# Altium footprint library RPSLib_Connectors.PcbLib: 85 footprints (part 2 of 6)
Each footprint in its own frame and in the unit in brackets; x right, y up, seen from the top. Pads: shape width x height; smd on the part's side, far side on the other; paste and mask are expansions set on the pad; w line width, h text height; cw(c..) or ccw(c..) is an arc to the next point about the centre after c.
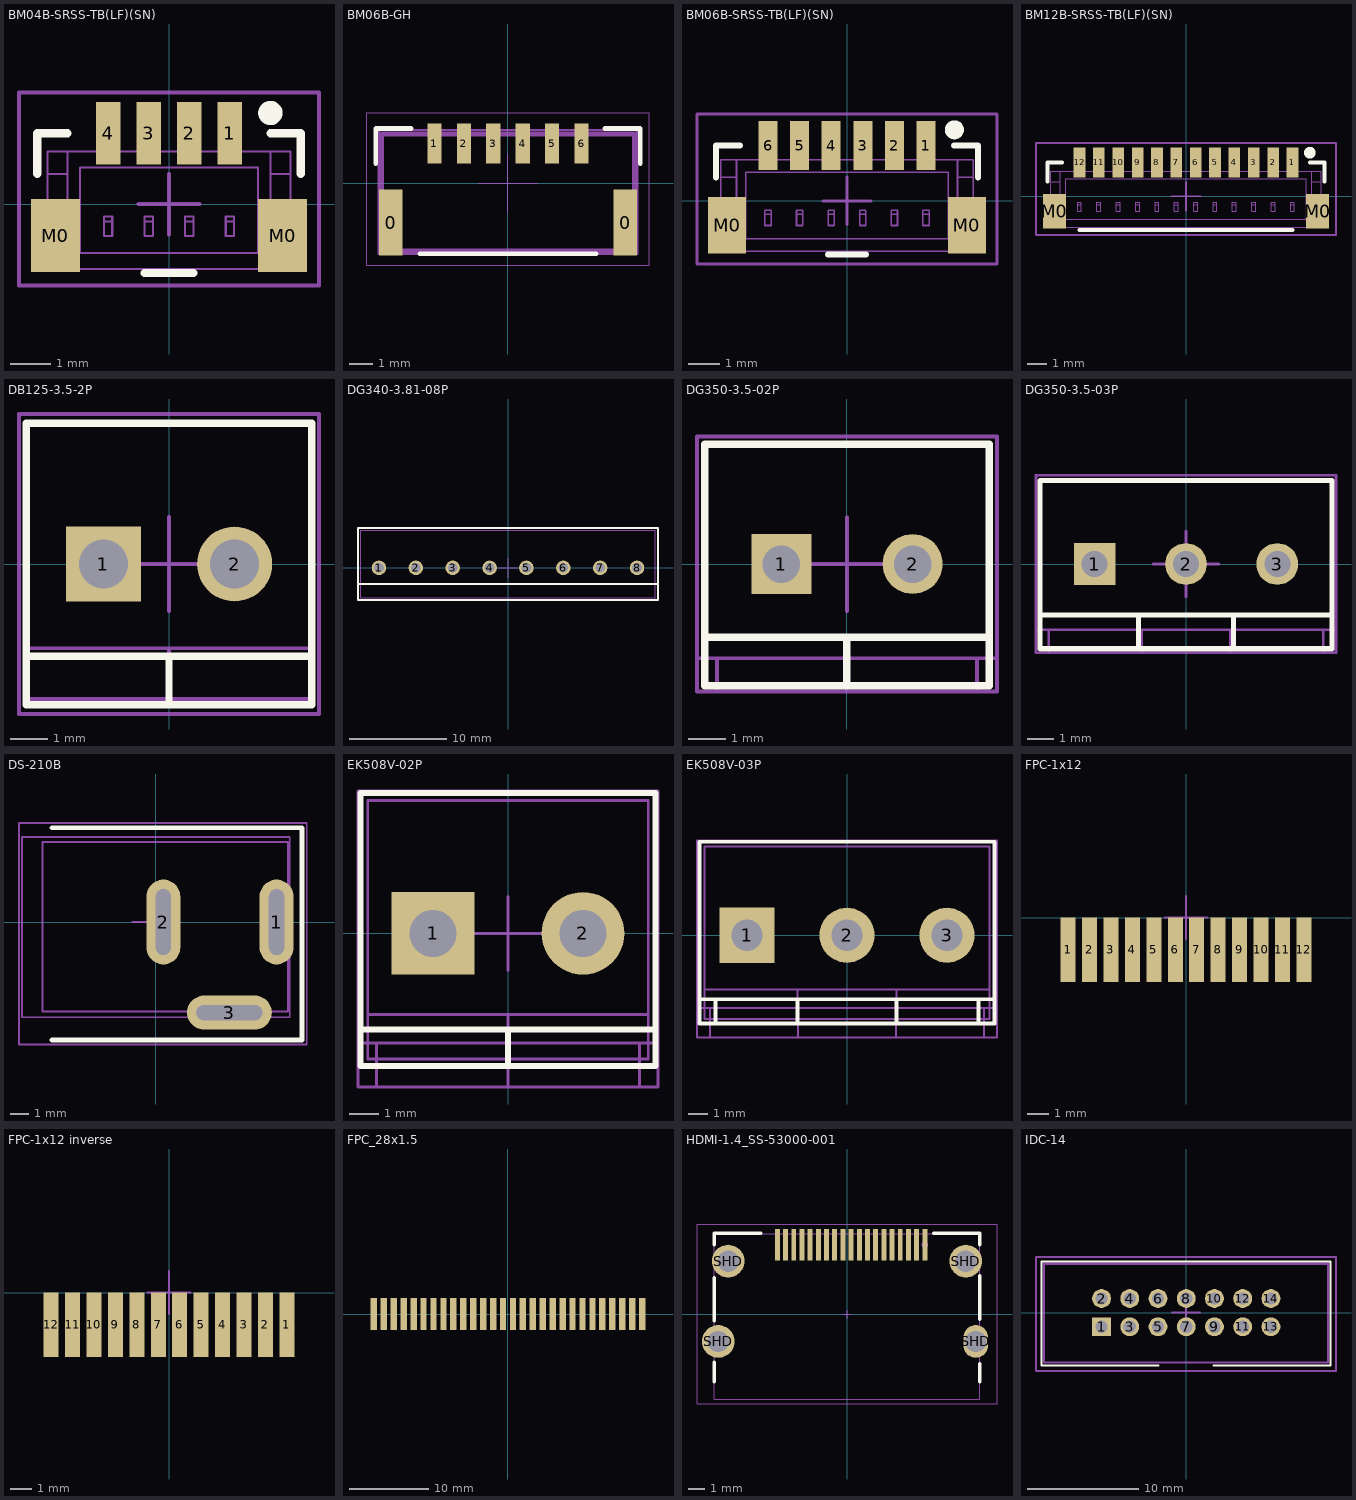
[diagram p1: the footprints below, top view; thin cyan lines are the x and y axes]

## BM04B-SRSS-TB(LF)(SN) [mm] "JST 1.0 mm pitch connector"
height 5
pads (6):
  rect 0.6x1.55 smd mask+0.07: 1(1.5,1.75) 2(0.5,1.75) 3(-0.5,1.75) 4(-1.5,1.75)
  rect 1.2x1.8 smd mask+0.07: M0(-2.8,-0.775) M0(2.8,-0.775)
Top Overlay:
  circle w0.4: c2.5,2.25 r0.1
  lines w0.2: -3.25,0.75 -3.25,1.75 -2.5,1.75 ; -0.6,-1.7 0.6,-1.7 ; 2.5,1.75 3.25,1.75 3.25,0.75
Top Designator:
  text ".Designator" at -2.868,-0.271 h1.2
Top Courtyard:
  lines w0.1: -0.75,0 0.75,0 ; 0,-0.75 0,0.75 ; -3.7,-2 3.7,-2 3.7,2.75 -3.7,2.75 -3.7,-2
Top 3D Body:
  lines w0.05: -2.5,0.75 -3,0.75 ; -1.6,1.3 -1.6,2 -1.4,2 -1.4,1.3 ; -0.6,1.3 -0.6,2 -0.4,2 -0.4,1.3 ; 0.4,1.3 0.4,2 0.6,2 0.6,1.3 ; 1.4,1.3 1.4,2 1.6,2 1.6,1.3 ; 2.5,0.75 3,0.75 ; -3,0.1 -3,-1.6 3,-1.6 3,0.1 ; -3,0.1 -3,0.75 ; -3,0.1 -2.5,0.1 -2.5,1.3 ; -3,0.75 -3,1.3 -2.5,1.3 ; -2.5,1.3 2.5,1.3 ; -2.2,-0.7 -2.2,-1.2 2.2,-1.2 2.2,-0.7 ; -2.2,-0.7 -2.2,-0.1 ; -2.2,-0.7 -2.55,-0.7 -2.55,-0.1 -2.2,-0.1 ; -2.2,-0.1 -2.2,0.9 2.2,0.9 2.2,-0.1 ; -1.6,-0.43 -1.6,-0.78 -1.4,-0.78 -1.4,-0.43 ; -1.6,-0.43 -1.4,-0.43 ; -1.6,-0.43 -1.6,-0.3 -1.4,-0.3 -1.4,-0.43 ; -0.6,-0.43 -0.4,-0.43 ; -0.6,-0.43 -0.6,-0.78 -0.4,-0.78 -0.4,-0.43 ; -0.6,-0.43 -0.6,-0.3 -0.4,-0.3 -0.4,-0.43 ; 0.4,-0.43 0.6,-0.43 ; 0.4,-0.43 0.4,-0.78 0.6,-0.78 0.6,-0.43 ; 0.4,-0.43 0.4,-0.3 0.6,-0.3 0.6,-0.43 ; 1.4,-0.43 1.4,-0.3 1.6,-0.3 1.6,-0.43 ; 1.4,-0.43 1.4,-0.78 1.6,-0.78 1.6,-0.43 ; 1.4,-0.43 1.6,-0.43 ; 2.2,-0.7 2.55,-0.7 2.55,-0.1 2.2,-0.1 ; 2.2,-0.7 2.2,-0.1 ; 2.5,1.3 2.5,0.1 3,0.1 ; 2.5,1.3 3,1.3 3,0.75 ; 3,0.1 3,0.75
3D body "BM04B-SRSS-TB.STEP": height 4.25, standoff -0.07, extent -3,-1.6 3,2

## BM06B-GH [mm]
height 4.05
pads (8):
  rect 1x2.8 smd paste-0.05: 0(-4.975,-1.675) 0(4.975,-1.675)
  rect 0.6x1.7 smd paste-0.05: 1(-3.125,1.675) 2(-1.875,1.675) 3(-0.625,1.675) 4(0.625,1.675) 5(1.875,1.675) 6(3.125,1.675)
Top Overlay:
  lines w0.2: -5.625,0.825 -5.625,2.325 -4.125,2.325 ; -3.75,-3 3.75,-3 ; 4.125,2.325 5.625,2.325 5.625,0.825
Top Designator:
  lines w0.1: -5.5,-3 -5.5,2.25 5.5,2.25 5.5,-3 -5.5,-3
  text ".Designator" at -2.868,-0.271 h1.2
Top Courtyard:
  lines w0.05: -1.25,0 1.25,0 ; 0,-1.25 0,1.25 ; -6,-3.5 -6,3 6,3 6,-3.5 -6,-3.5
Top 3D Body:
  lines w0.2: -5.375,-2.875 5.375,-2.875 5.375,2.075 -5.375,2.075 -5.375,-2.875
20:
  text ".Designator" at -1.126,-0.113 h0.5
3D body "BM06B-GHS-TBT.STEP": height 4.18, standoff -0.03, extent -5.375,-2.875 5.375,2.075

## BM06B-SRSS-TB(LF)(SN) [mm] "JST 1.0 mm pitch connector"
height 5
pads (8):
  rect 0.6x1.55 smd mask+0.07: 1(2.5,1.75) 2(1.5,1.75) 3(0.5,1.75) 4(-0.5,1.75) 5(-1.5,1.75) 6(-2.5,1.75)
  rect 1.2x1.8 smd mask+0.07: M0(-3.8,-0.775) M0(3.8,-0.775)
Top Overlay:
  circle w0.4: c3.4,2.25 r0.1
  lines w0.2: -4.15,0.75 -4.15,1.75 -3.4,1.75 ; -0.6,-1.7 0.6,-1.7 ; 3.4,1.75 4.15,1.75 4.15,0.75
Top Designator:
  text ".Designator" at -2.868,-0.271 h1.2
Top Courtyard:
  lines w0.1: -0.75,0 0.75,0 ; 0,-0.75 0,0.75 ; -4.75,-2 4.75,-2 4.75,2.75 -4.75,2.75 -4.75,-2
Top 3D Body:
  lines w0.05: -3.5,0.75 -4,0.75 ; -2.6,1.3 -2.6,2 -2.4,2 -2.4,1.3 ; -1.6,1.3 -1.6,2 -1.4,2 -1.4,1.3 ; -0.6,1.3 -0.6,2 -0.4,2 -0.4,1.3 ; 0.4,1.3 0.4,2 0.6,2 0.6,1.3 ; 1.4,1.3 1.4,2 1.6,2 1.6,1.3 ; 2.4,1.3 2.4,2 2.6,2 2.6,1.3 ; 3.5,0.75 4,0.75 ; -4,0.1 -4,0.75 ; -4,0.1 -3.5,0.1 -3.5,1.3 ; -4,0.1 -4,-1.6 4,-1.6 4,0.1 ; -4,0.75 -4,1.3 -3.5,1.3 ; -3.5,1.3 3.5,1.3 ; -3.2,-0.7 -3.2,-1.2 3.2,-1.2 3.2,-0.7 ; -3.2,-0.7 -3.2,-0.1 ; -3.2,-0.7 -3.55,-0.7 -3.55,-0.1 -3.2,-0.1 ; -3.2,-0.1 -3.2,0.9 3.2,0.9 3.2,-0.1 ; -2.6,-0.43 -2.6,-0.78 -2.4,-0.78 -2.4,-0.43 ; -2.6,-0.43 -2.4,-0.43 ; -2.6,-0.43 -2.6,-0.3 -2.4,-0.3 -2.4,-0.43 ; -1.6,-0.43 -1.4,-0.43 ; -1.6,-0.43 -1.6,-0.78 -1.4,-0.78 -1.4,-0.43 ; -1.6,-0.43 -1.6,-0.3 -1.4,-0.3 -1.4,-0.43 ; -0.6,-0.43 -0.4,-0.43 ; -0.6,-0.43 -0.6,-0.78 -0.4,-0.78 -0.4,-0.43 ; -0.6,-0.43 -0.6,-0.3 -0.4,-0.3 -0.4,-0.43 ; 0.4,-0.43 0.6,-0.43 ; 0.4,-0.43 0.4,-0.3 0.6,-0.3 0.6,-0.43 ; 0.4,-0.43 0.4,-0.78 0.6,-0.78 0.6,-0.43 ; 1.4,-0.43 1.4,-0.3 1.6,-0.3 1.6,-0.43 ; 1.4,-0.43 1.6,-0.43 ; 1.4,-0.43 1.4,-0.78 1.6,-0.78 1.6,-0.43 ; 2.4,-0.43 2.4,-0.78 2.6,-0.78 2.6,-0.43 ; 2.4,-0.43 2.4,-0.3 2.6,-0.3 2.6,-0.43 ; 2.4,-0.43 2.6,-0.43 ; 3.2,-0.7 3.2,-0.1 ; 3.2,-0.7 3.55,-0.7 3.55,-0.1 3.2,-0.1 ; 3.5,1.3 3.5,0.1 4,0.1 ; 3.5,1.3 4,1.3 4,0.75 ; 4,0.1 4,0.75
3D body "BM06B-SRSS-TB.STEP": height 4.25, standoff -0.07, extent -4,-1.6 4,2

## BM12B-SRSS-TB(LF)(SN) [mm] "JST 1.0 mm pitch connector"
height 5
pads (14):
  rect 0.6x1.55 smd mask+0.07: 1(5.5,1.75) 2(4.5,1.75) 3(3.5,1.75) 4(2.5,1.75) 5(1.5,1.75) 6(0.5,1.75) 7(-0.5,1.75) 8(-1.5,1.75) 9(-2.5,1.75) 10(-3.5,1.75) 11(-4.5,1.75) 12(-5.5,1.75)
  rect 1.2x1.8 smd mask+0.07: M0(-6.8,-0.775) M0(6.8,-0.775)
Top Overlay:
  circle w0.4: c6.4,2.25 r0.1
  lines w0.2: -7.15,0.75 -7.15,1.75 -6.4,1.75 ; -5.5,-1.75 5.5,-1.75 ; 6.4,1.75 7.15,1.75 7.15,0.75
Top Designator:
  text ".Designator" at -2.868,-0.271 h1.2
Top Courtyard:
  lines w0.1: -0.75,0 0.75,0 ; 0,-0.75 0,0.75 ; -7.75,-2 7.75,-2 7.75,2.75 -7.75,2.75 -7.75,-2
Top 3D Body:
  lines w0.05: -6.5,0.75 -7,0.75 ; -5.6,1.3 -5.6,2 -5.4,2 -5.4,1.3 ; -4.6,1.3 -4.6,2 -4.4,2 -4.4,1.3 ; -3.6,1.3 -3.6,2 -3.4,2 -3.4,1.3 ; -2.6,1.3 -2.6,2 -2.4,2 -2.4,1.3 ; -1.6,1.3 -1.6,2 -1.4,2 -1.4,1.3 ; -0.6,1.3 -0.6,2 -0.4,2 -0.4,1.3 ; 0.4,1.3 0.4,2 0.6,2 0.6,1.3 ; 1.4,1.3 1.4,2 1.6,2 1.6,1.3 ; 2.4,1.3 2.4,2 2.6,2 2.6,1.3 ; 3.4,1.3 3.4,2 3.6,2 3.6,1.3 ; 4.4,1.3 4.4,2 4.6,2 4.6,1.3 ; 5.4,1.3 5.4,2 5.6,2 5.6,1.3 ; 6.5,0.75 7,0.75 ; -7,0.1 -7,-1.6 7,-1.6 7,0.1 ; -7,0.1 -7,0.75 ; -7,0.1 -6.5,0.1 -6.5,1.3 ; -7,0.75 -7,1.3 -6.5,1.3 ; -6.5,1.3 6.5,1.3 ; -6.2,-0.7 -6.55,-0.7 -6.55,-0.1 -6.2,-0.1 ; -6.2,-0.7 -6.2,-0.1 ; -6.2,-0.7 -6.2,-1.2 6.2,-1.2 6.2,-0.7 ; -6.2,-0.1 -6.2,0.9 6.2,0.9 6.2,-0.1 ; -5.6,-0.43 -5.4,-0.43 ; -5.6,-0.43 -5.6,-0.78 -5.4,-0.78 -5.4,-0.43 ; -5.6,-0.43 -5.6,-0.3 -5.4,-0.3 -5.4,-0.43 ; -4.6,-0.43 -4.6,-0.78 -4.4,-0.78 -4.4,-0.43 ; -4.6,-0.43 -4.4,-0.43 ; -4.6,-0.43 -4.6,-0.3 -4.4,-0.3 -4.4,-0.43 ; -3.6,-0.43 -3.6,-0.3 -3.4,-0.3 -3.4,-0.43 ; -3.6,-0.43 -3.4,-0.43 ; -3.6,-0.43 -3.6,-0.78 -3.4,-0.78 -3.4,-0.43 ; -2.6,-0.43 -2.4,-0.43 ; -2.6,-0.43 -2.6,-0.3 -2.4,-0.3 -2.4,-0.43 ; -2.6,-0.43 -2.6,-0.78 -2.4,-0.78 -2.4,-0.43 ; -1.6,-0.43 -1.4,-0.43 ; -1.6,-0.43 -1.6,-0.3 -1.4,-0.3 -1.4,-0.43 ; -1.6,-0.43 -1.6,-0.78 -1.4,-0.78 -1.4,-0.43 ; -0.6,-0.43 -0.6,-0.3 -0.4,-0.3 -0.4,-0.43 ; -0.6,-0.43 -0.4,-0.43 ; -0.6,-0.43 -0.6,-0.78 -0.4,-0.78 -0.4,-0.43 ; 0.4,-0.43 0.4,-0.78 0.6,-0.78 0.6,-0.43 ; 0.4,-0.43 0.6,-0.43 ; 0.4,-0.43 0.4,-0.3 0.6,-0.3 0.6,-0.43 ; 1.4,-0.43 1.4,-0.3 1.6,-0.3 1.6,-0.43 ; 1.4,-0.43 1.4,-0.78 1.6,-0.78 1.6,-0.43 ; 1.4,-0.43 1.6,-0.43 ; 2.4,-0.43 2.4,-0.78 2.6,-0.78 2.6,-0.43 ; 2.4,-0.43 2.4,-0.3 2.6,-0.3 2.6,-0.43 ; 2.4,-0.43 2.6,-0.43 ; 3.4,-0.43 3.6,-0.43 ; 3.4,-0.43 3.4,-0.78 3.6,-0.78 3.6,-0.43 ; 3.4,-0.43 3.4,-0.3 3.6,-0.3 3.6,-0.43 ; 4.4,-0.43 4.6,-0.43 ; 4.4,-0.43 4.4,-0.78 4.6,-0.78 4.6,-0.43 ; 4.4,-0.43 4.4,-0.3 4.6,-0.3 4.6,-0.43 ; 5.4,-0.43 5.4,-0.3 5.6,-0.3 5.6,-0.43 ; 5.4,-0.43 5.6,-0.43 ; 5.4,-0.43 5.4,-0.78 5.6,-0.78 5.6,-0.43 ; 6.2,-0.7 6.55,-0.7 6.55,-0.1 6.2,-0.1 ; 6.2,-0.7 6.2,-0.1 ; 6.5,1.3 6.5,0.1 7,0.1 ; 6.5,1.3 7,1.3 7,0.75 ; 7,0.1 7,0.75
3D body "BM12B-SRSS-TB.STEP": height 4.35, standoff 0.03, extent -7,-1.6 7,2

## DB125-3.5-2P [mm] "Клеммник на плату 3.5 мм"
height 8.5
pads (2):
  rect 2x2 hole 1.3 mask+0.07: 1(-1.75,0)
  round 2 hole 1.3 mask+0.07: 2(1.75,0)
Top Overlay:
  lines w0.2: -3.8,-2.454 3.8,-2.454 ; 0,-3.75 0,-2.454 ; -3.8,-3.75 3.8,-3.75 3.8,3.75 -3.8,3.75 -3.8,-3.75
Top Designator:
  lines w0.1: -3.75,-2.245 3.75,-2.245 ; 0,-3.75 0,-2.245 ; -3.75,-3.75 3.75,-3.75 3.75,3.75 -3.75,3.75 -3.75,-3.75
  text ".Designator" at -2.868,-0.271 h1.2
Top Courtyard:
  lines w0.1: -1.25,0 1.25,0 ; 0,-1.25 0,1.25 ; -4,-4 -4,4 4,4 4,-4 -4,-4
Top 3D Body:
  lines w0.1: -3.75,-2.5 3.75,-2.5 ; 0,-3.6 0,-2.5 ; -3.75,-3.6 -3.75,3.7 3.75,3.7 3.75,-3.6 -3.75,-3.6
3D body "DB125-3.5-2P.stp": height 8.5, standoff -3.5, extent -3.75,-3.6 3.75,3.7

## DG340-3.81-08P [mm]
height 8.4
pads (8):
  round 1.5 hole 1 mask+0.07: 1(-13.335,0) 2(-9.525,0) 3(-5.715,0) 4(-1.905,0) 5(1.905,0) 6(5.715,0) 7(9.525,0) 8(13.335,0)
Top Overlay:
  lines w0.2: -15.5,-1.656 15.5,-1.656 ; -15.5,-3.3 15.5,-3.3 15.5,4.1 -15.5,4.1 -15.5,-3.3
Top Designator:
  text ".Designator" at -2.868,-0.271 h1.2
Top Courtyard:
  lines w0.1: -1,0 1,0 ; 0,-1 0,1
Top 3D Body:
  lines w0.1: -15.24,-3.1 -15.24,3.9 15.24,3.9 15.24,-3.1 -15.24,-3.1
3D body: height 3.4, standoff 0, extent -15.24,-3.1 15.24,3.9

## DG350-3.5-02P [mm] "Клеммник на плату 3.5 мм"
height 8.4
pads (2):
  rect 1.6x1.6 hole 1 mask+0.07: 1(-1.75,0)
  round 1.6 hole 1 mask+0.07: 2(1.75,0)
Top Overlay:
  lines w0.2: -3.8,-1.954 3.8,-1.954 ; 0,-3.25 0,-1.954 ; -3.8,-3.25 -3.8,3.2 3.8,3.2 3.8,-3.25 -3.8,-3.25
Top Designator:
  text ".Designator" at -2.868,-0.271 h1.2
Top Courtyard:
  lines w0.1: -1.25,0 1.25,0 ; 0,-1.25 0,1.25 ; -4,-3.4 4,-3.4 4,3.4 -4,3.4 -4,-3.4
Top 3D Body:
  lines w0.1: -4,-2.513 4,-2.513 ; -3.468,-3.4 -3.468,-2.513 ; 0,-3.4 0,-2.513 ; 3.468,-2.513 3.468,-3.4 3.51,-3.4 ; -4,-3.4 4,-3.4 4,3.4 -4,3.4 -4,-3.4
3D body "User Library-DG350-3,5-02P.step": height 8.4, standoff -3.4, extent -4,-3.4 4,3.4

## DG350-3.5-03P [mm] "Клеммник на плату 3.5 мм"
height 8.4
pads (3):
  rect 1.6x1.6 hole 1 mask+0.07: 1(-3.5,0)
  round 1.6 hole 1 mask+0.07: 2(0,0) 3(3.5,0)
Top Overlay:
  lines w0.2: -5.6,-1.954 5.6,-1.954 ; -1.826,-3.25 -1.826,-1.954 ; 1.826,-3.25 1.826,-1.954 ; -5.6,-3.25 -5.6,3.2 5.6,3.2 5.6,-3.25 -5.6,-3.25
Top Designator:
  text ".Designator" at -2.868,-0.271 h1.2
Top Courtyard:
  lines w0.1: -1.25,0 1.25,0 ; 0,-1.25 0,1.25 ; -5.75,-3.4 5.75,-3.4 5.75,3.4 -5.75,3.4 -5.75,-3.4
Top 3D Body:
  lines w0.1: -5.75,-2.513 5.75,-2.513 ; -5.268,-3.4 -5.268,-2.513 ; -1.699,-3.4 -1.699,-2.513 ; 1.699,-3.4 1.699,-2.513 ; 3.468,-3.4 3.51,-3.4 ; 5.268,-3.4 5.268,-2.513 ; -5.75,-3.4 5.75,-3.4 5.75,3.4 -5.75,3.4 -5.75,-3.4
3D body "User Library-DG350-3,5-03P.step": height 8.4, standoff -3.5, extent -5.75,-3.4 5.75,3.4

## DS-210B [mm] "Гнездо питания 2,1х5,5мм на панель"
height 11
pads (3):
  oval 1.8x4.5 hole 0.8 slot 3.5 at 90 deg: 1(6.4,0) 2(0.4,0)
  oval 4.5x1.8 hole 0.8 slot 3.5 at 0 deg: 3(3.9,-4.8)
Top Overlay:
  lines w0.254: -5.5,-6.25 7.75,-6.25 7.75,5 -5.5,5
Top Designator:
  lines w0.1: -6,-4.75 -6,4.25 7,4.25 7,-4.75 -6,-4.75
Top Courtyard:
  lines w0.1: -1.25,0 1.25,0 ; 0,-1.25 0,1.25 ; -7.25,-6.5 -7.25,5.25 8,5.25 8,-6.5 -7.25,-6.5
Top 3D Body:
  lines w0.1: -7.1,-5.05 -7.1,4.5 7.1,4.5 7.1,-5.05 -7.1,-5.05
3D body "DS-210B.stp": height 11, standoff -4.1, extent -7.1,-5.05 7.1,4.5

## EK508V-02P [mm] "Клеммник на плату 5.08 мм"
height 10
pads (2):
  rect 2.8x2.8 hole 1.6 mask+0.07: 1(-2.54,0)
  round 2.8 hole 1.6 mask+0.07: 2(2.54,0)
Top Overlay:
  lines w0.2: -4.999,-3.25 0.001,-3.25 ; 0.001,-4.485 0.001,-3.25 ; 5.001,-3.25 0.001,-3.25 ; -5,-4.485 -5,4.75 5,4.75 5,-4.485 -4.999,-4.485
Top Designator:
  lines w0.1: -4.75,-2.745 4.75,-2.745 ; 0,-4.25 0,-2.745 ; -4.75,-4.25 -4.75,4.5 4.75,4.5 4.75,-4.25 -4.75,-4.25
  text ".Designator" at -2.868,-0.271 h1.2
Top Courtyard:
  lines w0.1: -1.25,0 1.25,0 ; 0,-1.25 0,1.25 ; -5.08,-5.207 5.08,-5.207 5.08,4.826 -5.08,4.826 -5.08,-5.207
Top 3D Body:
  lines w0.1: -5.08,-3.705 5.08,-3.705 ; -4.456,-5.2 -4.456,-3.705 ; 0,-5.2 0,-3.705 ; 4.456,-5.2 4.456,-3.705 ; -5.08,-5.2 5.08,-5.2 5.08,4.8 -5.08,4.8 -5.08,-5.2
20:
  text ".Designator" at -1.126,-0.113 h0.5
3D body "EK508V-02P.stp": height 13.8, standoff -3.5, extent -5.08,-5.2 5.08,4.8

## EK508V-03P [mm] "Клеммник на плату 5.08 мм"
height 10
pads (3):
  rect 2.8x2.8 hole 1.6 mask+0.07: 1(-5.08,0)
  round 2.8 hole 1.6 mask+0.07: 2(0,0) 3(5.08,0)
Top Overlay:
  lines w0.2: -7.493,-3.25 0.001,-3.25 7.493,-3.25 ; -6.684,-4.485 -6.684,-3.25 ; -2.523,-4.485 -2.523,-3.25 ; 2.524,-4.485 2.524,-3.25 ; 6.685,-4.485 6.685,-3.25 ; -7.493,-4.485 7.493,-4.485 7.493,4.75 -7.493,4.75 -7.493,-4.485
Top Designator:
  lines w0.1: -7.25,-2.745 7.25,-2.745 ; -2.518,-4.25 -2.518,-2.745 ; 2.518,-4.25 2.518,-2.745 ; -7.25,-4.25 7.25,-4.25 7.25,4.5 -7.25,4.5 -7.25,-4.25
  text ".Designator" at -2.868,-0.271 h1.2
Top Courtyard:
  lines w0.1: -1.25,0 1.25,0 ; 0,-1.25 0,1.25 ; -7.62,-5.207 -7.62,4.826 7.62,4.826 7.62,-5.207 -7.62,-5.207
Top 3D Body:
  lines w0.1: -7.62,-3.705 7.62,-3.705 ; -6.956,-5.2 -6.956,-3.705 ; -2.5,-5.2 -2.5,-3.705 ; 2.5,-5.2 2.5,-3.705 ; 6.956,-5.2 6.956,-3.705 ; -7.62,-5.2 -7.62,4.8 7.62,4.8 7.62,-5.2 -7.62,-5.2
20:
  text ".Designator" at -1.126,-0.113 h0.5
3D body "EK508V-03P.stp": height 13.8, standoff -3.5, extent -7.62,-5.2 7.62,4.8

## FPC-1x12 [mm] "FPC cable 1 mm pitch, 12 pos"
pads (12):
  rect 0.7x3 smd mask+0.07: 1(-5.5,-1.5) 2(-4.5,-1.5) 3(-3.5,-1.5) 4(-2.5,-1.5) 5(-1.5,-1.5) 6(-0.5,-1.5) 7(0.5,-1.5) 8(1.5,-1.5) 9(2.5,-1.5) 10(3.5,-1.5) 11(4.5,-1.5) 12(5.5,-1.5)
Top Designator:
  text ".Designator" at -2.868,-0.271 h1.2
Top Courtyard:
  lines w0.1: -1,0 1,0 ; 0,-1 0,1

## FPC-1x12 inverse [mm] "FPC cable 1 mm pitch, 12 pos"
pads (12):
  rect 0.7x3 smd mask+0.07: 1(5.5,-1.5) 2(4.5,-1.5) 3(3.5,-1.5) 4(2.5,-1.5) 5(1.5,-1.5) 6(0.5,-1.5) 7(-0.5,-1.5) 8(-1.5,-1.5) 9(-2.5,-1.5) 10(-3.5,-1.5) 11(-4.5,-1.5) 12(-5.5,-1.5)
Top Designator:
  text ".Designator" at -2.868,-0.271 h1.2
Top Courtyard:
  lines w0.1: -1,0 1,0 ; 0,-1 0,1

## FPC_28x1.5 [mm]
pads (28):
  rect 0.8x4 smd mask+0.07: 1(-16.875,0) 2(-15.625,0) 3(-14.375,0) 4(-13.125,0) 5(-11.875,0) 6(-10.625,0) 7(-9.375,0) 8(-8.125,0) 9(-6.875,0) 10(-5.625,0) 11(-4.375,0) 12(-3.125,0) 13(-1.875,0) 14(-0.625,0) 15(0.625,0) 16(1.875,0) 17(3.125,0) 18(4.375,0) 19(5.625,0) 20(6.875,0) 21(8.125,0) 22(9.375,0) 23(10.625,0) 24(11.875,0) 25(13.125,0) 26(14.375,0) 27(15.625,0) 28(16.875,0)
Top Designator:
  text ".Designator" at -2.868,-0.271 h1.2

## HDMI-1.4_SS-53000-001 [mm] "High Definition Multi Media Interface Connector"
pads (25):
  rect 0.3x1.9 smd: 1(4.75,4.25) 1(4.75,4.25) 1(4.75,4.25) 2(4.25,4.25) 3(3.75,4.25) 4(3.25,4.25) 5(2.75,4.25) 6(2.25,4.25) 7(1.75,4.25) 8(1.25,4.25) 9(0.75,4.25) 10(0.25,4.25) 11(-0.25,4.25) 12(-0.75,4.25) 13(-1.25,4.25) 14(-1.75,4.25) 15(-2.25,4.25) 16(-2.75,4.25) 17(-3.25,4.25) 18(-3.75,4.25) 19(-4.25,4.25)
  round 2 hole 1.3: SHD(-7.85,-1.65) SHD(-7.25,3.25) SHD(7.25,3.25)
  oval 1.5x2 hole 1.3: SHD(7.85,-1.65)
Top Overlay:
  lines w0.2: -8.1,-4.1 -8.1,-2.9 ; -8.1,-0.4 -8.1,2.25 ; -8.1,4.25 -8.1,4.95 -5.245,4.95 ; 5.3,4.946 8.105,4.946 ; 8.1,-4.1 8.1,-3 ; 8.1,-0.3 8.1,2.35 ; 8.1,4.25 8.1,4.95
Top Courtyard:
  lines w0.05: -0.25,0 0.25,0 ; 0,-0.25 0,0.25 ; -9.15,-5.45 9.15,-5.45 9.15,5.5 -9.15,5.5 -9.15,-5.45
Top Assembly:
  circle w0.254: c4.75,4.25 r0.071
  lines w0.05: -8.1,-5.17 8.1,-5.17 8.1,4.93 -8.1,4.93 -8.1,-5.17
  text ".Designator" at -4.814,0.617 h1
3D body "SS-53000-001--3DModel-STEP-1.STEP": height 6.18, standoff -1.95, extent -8.1,-5.17 8.1,4.93

## IDC-14 [mm] "2.54 мм разъем"
height 9.1
pads (14):
  rect 1.7x1.7 hole 1.1: 1(-7.6,-1.27)
  round 1.7 hole 1.1: 2(-7.6,1.27) 3(-5.06,-1.27) 4(-5.06,1.27) 5(-2.52,-1.27) 6(-2.52,1.27) 7(0.02,-1.27) 8(0.02,1.27) 9(2.56,-1.27) 10(2.56,1.27) 11(5.1,-1.27) 12(5.1,1.27) 13(7.64,-1.27) 14(7.64,1.27)
Top Overlay:
  lines w0.2: -2.5,-4.75 -13,-4.75 -13,4.6 13,4.6 13,-4.75 2.5,-4.75
Top Designator:
  text ".Designator" at -2.868,-0.271 h1.2
Top Courtyard:
  lines w0.2: -1.25,0 1.25,0 ; 0,-1.25 0,1.25 ; -13.5,-5.25 13.5,-5.25 13.5,5 -13.5,5 -13.5,-5.25
Top 3D Body:
  lines w0.2: -12.79,-4.5 -12.79,4.4 12.79,4.4 12.79,-4.5 -12.79,-4.5
3D body "IDC-20.stp": height 9, standoff -3.6, extent -12.79,-4.5 12.79,4.4